# Altium footprint library 04.连接器件.pcb.PCBLIB: 363 footprints (part 13 of 23)
Each footprint in its own frame and in the unit in brackets; x right, y up, seen from the top. Pads: shape width x height; smd on the part's side, far side on the other; paste and mask are expansions set on the pad; w line width, h text height; cw(c..) or ccw(c..) is an arc to the next point about the centre after c.
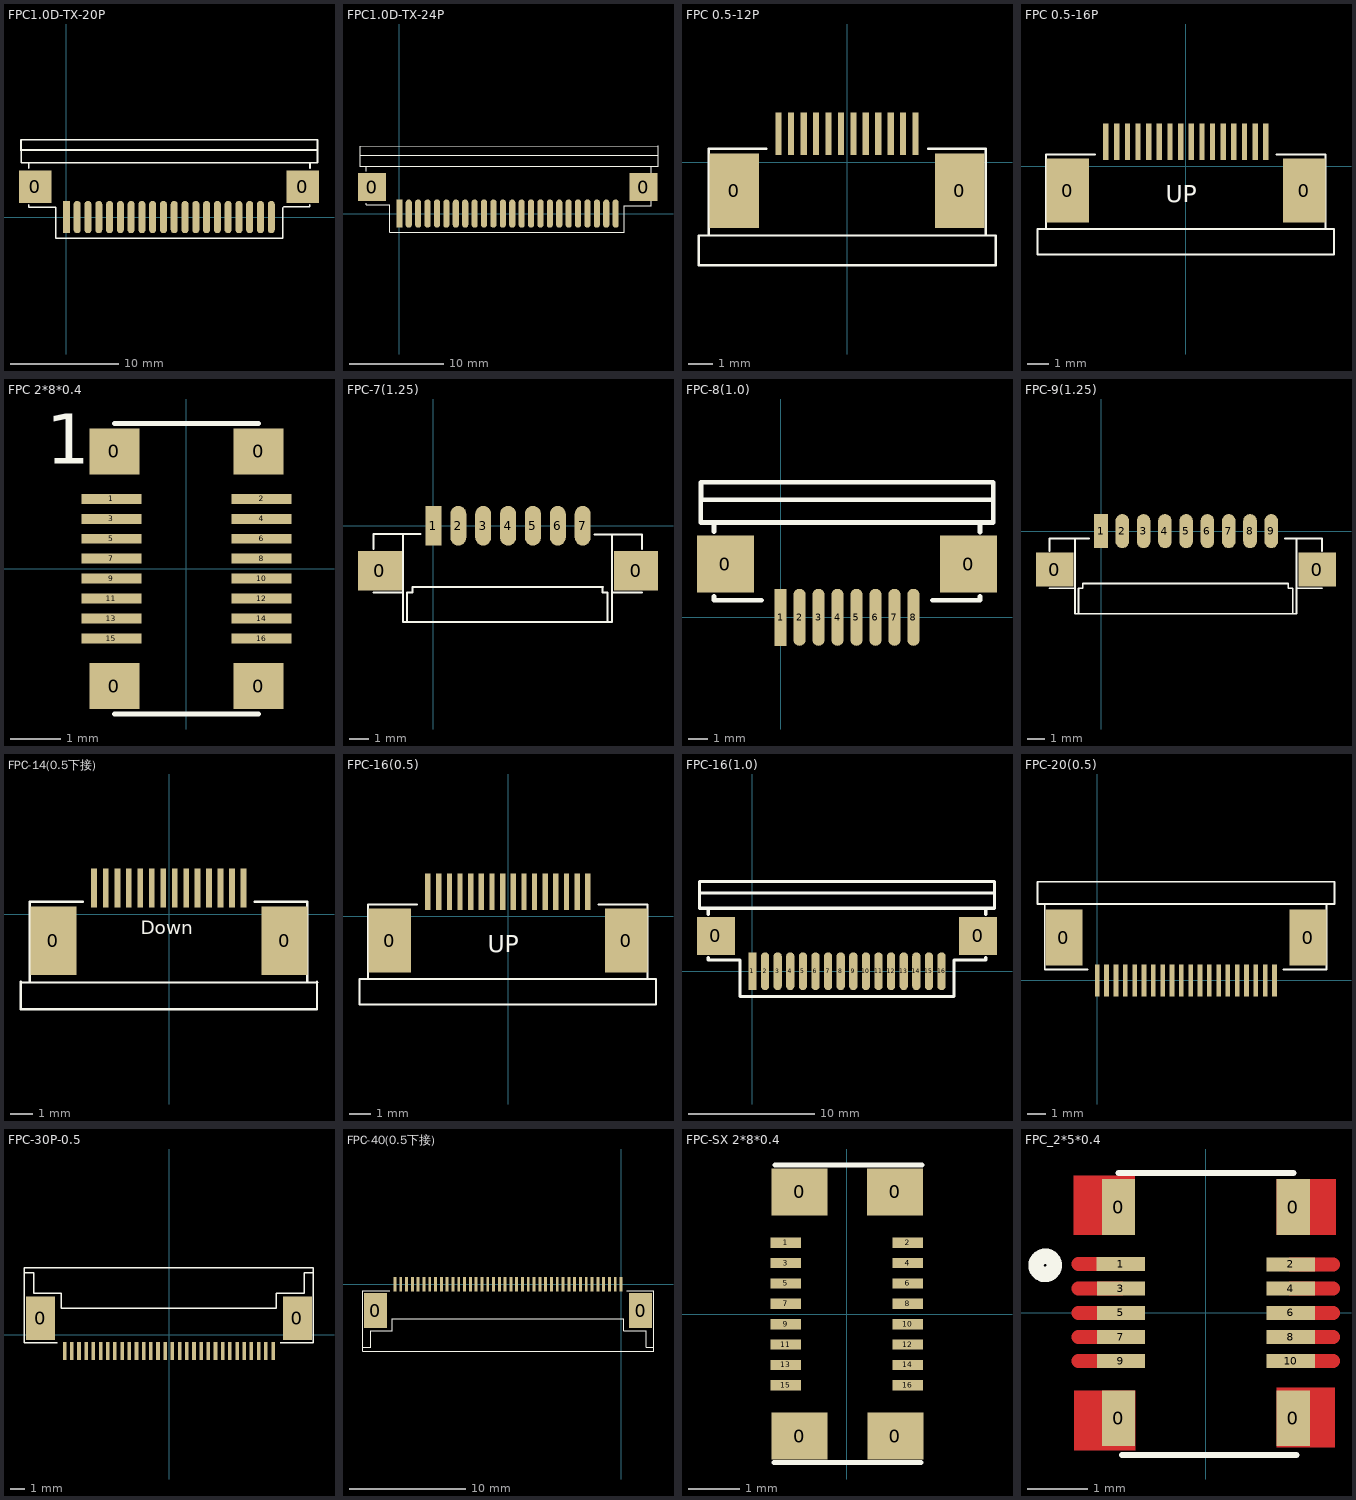
[diagram p12: the footprints below, top view; thin cyan lines are the x and y axes]

## FPC1.0D-TX-20P [mm]
pads (22):
  rect 3x3 smd: 0(-2.899,2.822) 0(21.929,2.819)
  rect 0.65x3 smd: 1(0,0)
  oval 0.65x3 smd: 2(1,0) 3(2,0) 4(3,0) 5(4,0) 6(5,0) 7(6,0) 8(7,0) 9(8,0) 10(9,0) 11(10,0) 12(11,0) 13(12,0) 14(13,0) 15(14,0) 16(15,0) 17(16,0) 18(17,0) 19(18,0) 20(19,0)
TopOverlay:
  lines w0.15: -4.199,6.222 23.3,6.223 ; -3.499,1.122 -3.499,0.922 -0.999,0.922 -0.999,-1.978 20.049,-1.981 20.049,0.838 20.151,0.94 22.564,0.94 22.564,1.143 ; -3.499,4.522 -3.499,5.022 -4.199,5.022 ; 22.589,5.029 -4.199,5.022 ; 22.591,4.514 22.591,5.022 23.291,5.022 23.291,7.122 ; 23.3,7.163 -4.208,7.188 -4.199,5.022

## FPC1.0D-TX-24P [mm]
pads (26):
  rect 3x3 smd: 0(-2.899,2.822) 0(25.961,2.822)
  rect 0.65x3 smd: 1(0,0)
  oval 0.65x3 smd: 2(1,0) 3(2,0) 4(3,0) 5(4,0) 6(5,0) 7(6,0) 8(7,0) 9(8,0) 10(9,0) 11(10,0) 12(11,0) 13(12,0) 14(13,0) 15(14,0) 16(15,0) 17(16,0) 18(17,0) 19(18,0) 20(19,0) 21(20,0) 22(21,0) 23(22,0) 24(23,0)
TopOverlay:
  lines w0.1: -4.199,6.222 27.5,6.223 ; -3.499,1.122 -3.499,0.922 -0.999,0.922 -0.999,-1.978 23.927,-1.981 23.927,0.838 26.799,0.838 26.799,1.295 ; -3.499,4.522 -3.499,5.022 -4.199,5.022 ; 26.799,4.369 26.799,5.029 ; -4.199,5.022 -4.208,7.188 27.5,7.214 27.5,5.029 -4.199,5.022

## FPC 0.5-12P [mm]
pads (14):
  rect 2x3 smd: 0(-4.536,-1.146) 0(4.536,-1.146)
  rect 0.25x1.7 smd: 1(-2.758,1.146) 2(-2.25,1.146) 3(-1.742,1.146) 4(-1.242,1.146) 5(-0.742,1.146) 6(-0.242,1.146) 7(0.258,1.146) 8(0.758,1.146) 9(1.258,1.146) 10(1.758,1.146) 11(2.258,1.146) 12(2.758,1.146)
TopOverlay:
  lines w0.1: -5.566,-2.946 -5.566,0.554 -3.258,0.554 ; 3.275,0.554 5.583,0.554 5.583,-2.946 ; -5.961,-4.146 -5.961,-2.946 5.986,-2.946 5.986,-4.146 -5.961,-4.146
3D body: height 2.3, standoff 0, extent -3.515,-2.925 3.507,0.55
3D body: height 0.3, standoff 0, extent -2.89,0.2 -2.64,1.65
3D body: height 0.3, standoff 0, extent -2.382,0.2 -2.132,1.65
3D body: height 0.3, standoff 0, extent -1.874,0.2 -1.624,1.65
3D body: height 0.3, standoff 0, extent -1.374,0.2 -1.124,1.65
3D body: height 0.3, standoff 0, extent -0.874,0.2 -0.624,1.65
3D body: height 0.3, standoff 0, extent -0.374,0.2 -0.124,1.65
3D body: height 0.3, standoff 0, extent 0.126,0.2 0.376,1.65
3D body: height 0.3, standoff 0, extent 0.626,0.2 0.876,1.65
3D body: height 0.3, standoff 0, extent 1.126,0.2 1.376,1.65
3D body: height 0.3, standoff 0, extent 1.626,0.2 1.876,1.65
3D body: height 0.3, standoff 0, extent 2.126,0.2 2.376,1.65
3D body: height 0.3, standoff 0, extent 2.626,0.2 2.876,1.65
3D body: height 2.4, standoff 0, extent 3.448,-2.921 5.748,0.554
3D body: height 2.4, standoff 0, extent -5.707,-2.95 -3.407,0.525
3D body: height 2.4, standoff 0, extent -5.986,-4.198 6.039,-2.896

## FPC 0.5-16P [mm]
pads (18):
  rect 2x3 smd: 0(-5.546,-1.146) 0(5.546,-1.146)
  rect 0.25x1.7 smd: 1(-3.768,1.146) 2(-3.26,1.146) 3(-2.752,1.146) 4(-2.252,1.146) 5(-1.752,1.146) 6(-1.252,1.146) 7(-0.752,1.146) 8(-0.252,1.146) 9(0.248,1.146) 10(0.748,1.146) 11(1.248,1.146) 12(1.748,1.146) 13(2.248,1.146) 14(2.748,1.146) 15(3.248,1.146) 16(3.748,1.146)
TopOverlay:
  lines w0.1: -6.577,-2.946 -6.577,0.554 -4.268,0.554 ; 4.248,0.554 6.556,0.554 6.556,-2.946 ; 6.95,-4.146 -6.972,-4.146 -6.972,-2.946 6.95,-2.946 ; 6.951,-4.146 6.951,-2.946
  text "UP" at -0.94,-1.702 h0.8
3D body: height 2.4, standoff 0, extent -6.996,-4.175 6.95,-2.896
3D body: height 2.4, standoff 0, extent -6.717,-2.95 -4.417,0.525
3D body: height 2.4, standoff 0, extent 4.375,-2.95 6.675,0.525
3D body: height 0.3, standoff 0, extent 3.616,0.2 3.866,1.65
3D body: height 0.3, standoff 0, extent 3.116,0.2 3.366,1.65
3D body: height 0.3, standoff 0, extent 2.616,0.2 2.866,1.65
3D body: height 0.3, standoff 0, extent 2.116,0.2 2.366,1.65
3D body: height 0.3, standoff 0, extent 1.616,0.2 1.866,1.65
3D body: height 0.3, standoff 0, extent 1.116,0.2 1.366,1.65
3D body: height 0.3, standoff 0, extent 0.616,0.2 0.866,1.65
3D body: height 0.3, standoff 0, extent 0.116,0.2 0.366,1.65
3D body: height 0.3, standoff 0, extent -0.384,0.2 -0.134,1.65
3D body: height 0.3, standoff 0, extent -0.884,0.2 -0.634,1.65
3D body: height 0.3, standoff 0, extent -1.384,0.2 -1.134,1.65
3D body: height 0.3, standoff 0, extent -1.884,0.2 -1.634,1.65
3D body: height 0.3, standoff 0, extent -2.384,0.2 -2.134,1.65
3D body: height 0.3, standoff 0, extent -2.884,0.2 -2.634,1.65
3D body: height 0.3, standoff 0, extent -3.392,0.2 -3.142,1.65
3D body: height 0.3, standoff 0, extent -3.9,0.2 -3.65,1.65
3D body: height 2.3, standoff 0, extent -4.525,-2.925 4.525,0.55

## FPC 2*8*0.4 [mm]
pads (20):
  rect 1x0.92 smd: 0(-1.445,-2.35) 0(-1.445,2.35) 0(1.445,-2.35) 0(1.445,2.35)
  rect 1.2x0.2 smd: 1(-1.505,1.4) 2(1.505,1.4) 3(-1.505,1) 4(1.505,1) 5(-1.505,0.6) 6(1.505,0.6) 7(-1.505,0.2) 8(1.505,0.2) 9(-1.505,-0.2) 10(1.505,-0.2) 11(-1.505,-0.6) 12(1.505,-0.6) 13(-1.505,-1) 14(1.505,-1) 15(-1.505,-1.4) 16(1.505,-1.4)
TopOverlay:
  lines w0.1: -1.445,-2.91 1.445,-2.91 ; -1.445,2.91 1.445,2.91
  text "1" at -2.803,2.099 h1
3D body: height 0.85, standoff 0, extent -1.45,-2.925 1.475,2.9

## FPC-7(1.25) [mm]
pads (9):
  rect 2.2x2 smd: 0(-2.692,-2.261) 0(10.185,-2.261)
  rect 0.8x2 smd: 1(0,0)
  oval 0.8x2 smd: 2(1.25,0) 3(2.5,0) 4(3.75,0) 5(5,0) 6(6.25,0) 7(7.5,0)
TopOverlay:
  lines w0.1: -3.023,-3.353 -1.523,-3.353 ; -3.023,-1.17 -3.023,-0.428 -0.639,-0.428 ; -1.523,-0.432 -1.523,-3.353 ; -1.319,-4.853 -1.319,-3.353 -1.065,-3.353 -1.065,-3.073 8.509,-3.073 ; 8.081,-0.432 10.465,-0.432 ; 8.5,-3.073 8.5,-3.353 8.754,-3.353 8.754,-4.853 ; 8.966,-4.851 -1.523,-4.853 -1.523,-3.353 ; 8.977,-4.853 8.977,-3.353 8.977,-0.437 ; 8.977,-3.358 10.477,-3.358 ; 10.477,-1.175 10.477,-0.432

## FPC-8(1.0) [mm]
pads (10):
  rect 3x3 smd: 0(-2.9,2.8) 0(9.9,2.8)
  rect 0.65x3 smd: 1(0,0)
  oval 0.65x3 smd: 2(1,0) 3(2,0) 4(3,0) 5(4,0) 6(5,0) 7(6,0) 8(7,0)
TopOverlay:
  lines w0.254: -4.2,6.2 11.2,6.192 ; -3.5,1.1 -3.5,0.9 -1,0.9 ; -3.5,4.5 -3.5,5 -4.2,5 ; 8,0.9 10.5,0.9 10.5,1.1 ; 10.5,4.492 10.5,5 11.2,5 ; 11.176,7.112 -4.191,7.112 -4.2,5 ; 11.2,7.1 11.2,5 ; -4.2,5 11.2,5
3D body: height 2.5, standoff 0, extent -4.2,0.9 11.2,7.112

## FPC-9(1.25) [mm]
pads (11):
  rect 2.2x2 smd: 0(-2.718,-2.261) 0(12.7,-2.261)
  rect 0.8x2 smd: 1(0,0)
  oval 0.8x2 smd: 2(1.25,0) 3(2.5,0) 4(3.75,0) 5(5,0) 6(6.25,0) 7(7.5,0) 8(8.75,0) 9(10,0)
TopOverlay:
  lines w0.1: -3.023,-3.353 -1.523,-3.353 ; -3.023,-1.17 -3.023,-0.428 -0.707,-0.428 ; -1.523,-0.432 -1.523,-3.353 ; -1.319,-4.853 -1.319,-3.353 -1.065,-3.353 -1.065,-3.073 11,-3.073 11,-3.353 11.254,-3.353 11.254,-4.853 ; 10.791,-0.428 12.977,-0.428 ; 11.477,-3.358 12.977,-3.358 ; 11.477,-0.437 11.477,-3.353 11.477,-4.853 -1.523,-4.853 -1.523,-3.353 ; 12.977,-1.175 12.977,-0.432

## FPC-14(0.5下接) [mm]
pads (16):
  rect 2x3 smd: 0(-5.046,-1.146) 0(5.046,-1.146)
  rect 0.25x1.7 smd: 1(-3.268,1.146) 2(-2.76,1.146) 3(-2.252,1.146) 4(-1.752,1.146) 5(-1.252,1.146) 6(-0.752,1.146) 7(-0.252,1.146) 8(0.248,1.146) 9(0.748,1.146) 10(1.248,1.146) 11(1.748,1.146) 12(2.248,1.146) 13(2.748,1.146) 14(3.248,1.146)
TopOverlay:
  lines w0.1: -6.472,-4.146 -6.472,-2.946 ; -6.472,-2.971 6.474,-2.971 ; -6.418,-4.146 6.461,-4.146 6.461,-2.946 ; -6.077,-2.946 -6.077,0.554 -3.768,0.554 ; 3.732,0.554 6.036,0.554 6.036,-2.946
  text "Down" at -1.243,-1.054 h1

## FPC-16(0.5) [mm]
pads (18):
  rect 2x3 smd: 0(-5.546,-1.146) 0(5.546,-1.146)
  rect 0.25x1.7 smd: 1(-3.768,1.146) 2(-3.26,1.146) 3(-2.752,1.146) 4(-2.252,1.146) 5(-1.752,1.146) 6(-1.252,1.146) 7(-0.752,1.146) 8(-0.252,1.146) 9(0.248,1.146) 10(0.748,1.146) 11(1.248,1.146) 12(1.748,1.146) 13(2.248,1.146) 14(2.748,1.146) 15(3.248,1.146) 16(3.748,1.146)
TopOverlay:
  lines w0.1: -6.577,-2.946 -6.577,0.554 -4.268,0.554 ; 4.248,0.554 6.556,0.554 6.556,-2.946 ; 6.95,-4.146 -6.972,-4.146 -6.972,-2.946 6.95,-2.946 ; 6.951,-4.146 6.951,-2.946
  text "UP" at -0.94,-1.702 h0.8
3D body: height 2.3, standoff 0, extent -4.525,-2.925 4.525,0.55
3D body: height 0.3, standoff 0, extent -3.9,0.2 -3.65,1.65
3D body: height 0.3, standoff 0, extent -3.392,0.2 -3.142,1.65
3D body: height 0.3, standoff 0, extent -2.884,0.2 -2.634,1.65
3D body: height 0.3, standoff 0, extent -2.384,0.2 -2.134,1.65
3D body: height 0.3, standoff 0, extent -1.884,0.2 -1.634,1.65
3D body: height 0.3, standoff 0, extent -1.384,0.2 -1.134,1.65
3D body: height 0.3, standoff 0, extent -0.884,0.2 -0.634,1.65
3D body: height 0.3, standoff 0, extent -0.384,0.2 -0.134,1.65
3D body: height 0.3, standoff 0, extent 0.116,0.2 0.366,1.65
3D body: height 0.3, standoff 0, extent 0.616,0.2 0.866,1.65
3D body: height 0.3, standoff 0, extent 1.116,0.2 1.366,1.65
3D body: height 0.3, standoff 0, extent 1.616,0.2 1.866,1.65
3D body: height 0.3, standoff 0, extent 2.116,0.2 2.366,1.65
3D body: height 0.3, standoff 0, extent 2.616,0.2 2.866,1.65
3D body: height 0.3, standoff 0, extent 3.116,0.2 3.366,1.65
3D body: height 0.3, standoff 0, extent 3.616,0.2 3.866,1.65
3D body: height 2.4, standoff 0, extent 4.375,-2.95 6.675,0.525
3D body: height 2.4, standoff 0, extent -6.717,-2.95 -4.417,0.525
3D body: height 2.4, standoff 0, extent -6.996,-4.175 6.95,-2.896

## FPC-16(1.0) [mm]
pads (18):
  rect 3x3 smd: 0(-2.9,2.8) 0(17.9,2.8)
  rect 0.65x3 smd: 1(0,0)
  oval 0.65x3 smd: 2(1,0) 3(2,0) 4(3,0) 5(4,0) 6(5,0) 7(6,0) 8(7,0) 9(8,0) 10(9,0) 11(10,0) 12(11,0) 13(12,0) 14(13,0) 15(14,0) 16(15,0)
TopOverlay:
  lines w0.254: -4.2,6.2 19.191,6.188 ; -3.5,1.1 -3.5,0.9 -1,0.9 -1,-2 16,-2 16,0.9 18.5,0.9 18.5,1.1 ; -3.5,4.5 -3.5,5 -4.2,5 ; 18.5,4.492 18.5,5 19.2,5 ; 19.188,7.112 -4.191,7.112 -4.2,5 ; 19.2,7.1 19.2,5 ; -4.2,5 19.2,5

## FPC-20(0.5) [mm]
pads (22):
  rect 2x3 smd: 0(-1.778,2.292) 0(11.314,2.292)
  rect 0.25x1.7 smd: 1(0,0) 2(0.508,0) 3(1.016,0) 4(1.516,0) 5(2.016,0) 6(2.516,0) 7(3.016,0) 8(3.516,0) 9(4.016,0) 10(4.516,0) 11(5.016,0) 12(5.516,0) 13(6.016,0) 14(6.516,0) 15(7.016,0) 16(7.516,0) 17(8.016,0) 18(8.516,0) 19(9.016,0) 20(9.516,0)
TopOverlay:
  lines w0.1: -2.808,4.092 -2.808,0.592 -0.5,0.592 ; 10,0.592 12.305,0.592 12.305,4.092 ; -3.203,4.092 12.729,4.092 12.729,5.292 12,5.292 -3.203,5.292 -3.203,4.092

## FPC-30P-0.5 [mm]
pads (32):
  rect 2x3 smd: 0(-8.939,1.143) 0(8.939,1.143)
  rect 0.25x1.25 smd: 1(7.253,-1.143) 2(6.745,-1.143) 3(6.237,-1.143) 4(5.737,-1.143) 5(5.237,-1.143) 6(4.737,-1.143) 7(4.237,-1.143) 8(3.737,-1.143) 9(3.237,-1.143) 10(2.737,-1.143) 11(2.237,-1.143) 12(1.737,-1.143) 13(1.237,-1.143) 14(0.737,-1.143) 15(0.237,-1.143) 16(-0.263,-1.143) 17(-0.763,-1.143) 18(-1.263,-1.143) 19(-1.763,-1.143) 20(-2.263,-1.143) 21(-2.763,-1.143) 22(-3.263,-1.143) 23(-3.763,-1.143) 24(-4.263,-1.143) 25(-4.763,-1.143) 26(-5.262,-1.143) 27(-5.762,-1.143) 28(-6.262,-1.143) 29(-6.762,-1.143) 30(-7.262,-1.143)
TopOverlay:
  lines w0.1: -10.06,4.318 -9.425,4.318 -9.425,2.87 -7.494,2.87 -7.494,1.854 2.466,1.854 7.466,1.854 7.466,2.87 9.396,2.87 9.396,4.318 10.031,4.318 ; -7.762,-0.551 -10.071,-0.551 -10.071,4.642 5.042,4.642 10.042,4.642 10.042,-0.551 7.737,-0.551
3D body: height 0.2, standoff 0, extent -7.516,-1.778 7.47,-0.508
3D body: height 2, standoff 0, extent -10.056,-0.635 10.01,4.699

## FPC-40(0.5下接) [mm] "0.5K-DX-20PWB掀盖"
height 2
pads (42):
  rect 2x3 smd: 0(-21.192,-2.286) 0(1.692,-2.286)
  rect 0.25x1.25 smd: 1(0,0) 2(-0.5,0) 3(-1,0) 4(-1.5,0) 5(-2,0) 6(-2.5,0) 7(-3,0) 8(-3.5,0) 9(-4,0) 10(-4.5,0) 11(-5,0) 12(-5.5,0) 13(-6,0) 14(-6.5,0) 15(-7,0) 16(-7.5,0) 17(-8,0) 18(-8.5,0) 19(-9,0) 20(-9.5,0) 21(-10,0) 22(-10.5,0) 23(-11,0) 24(-11.5,0) 25(-12,0) 26(-12.5,0) 27(-13,0) 28(-13.5,0) 29(-14,0) 30(-14.5,0) 31(-15,0) 32(-15.5,0) 33(-16,0) 34(-16.5,0) 35(-17,0) 36(-17.5,0) 37(-18,0) 38(-18.5,0) 39(-19,0) 40(-19.5,0)
TopOverlay:
  lines w0.1: -22.282,-5.461 -21.59,-5.461 -21.59,-4.013 -19.748,-4.013 -19.748,-3.189 -19.748,-2.997 0.248,-2.997 0.248,-4.013 2.178,-4.013 2.178,-5.461 2.813,-5.461 ; -19.974,-0.592 -22.285,-0.592 -22.285,-5.785 2.824,-5.785 2.824,-0.592 0.516,-0.592

## FPC-SX 2*8*0.4 [mm]
pads (20):
  rect 1.1x0.92 smd: 0(-0.93,-2.4) 0(-0.93,2.4) 0(0.95,2.4) 0(0.957,-2.4)
  rect 0.6x0.2 smd: 1(-1.2,1.4) 2(1.2,1.4) 3(-1.2,1) 4(1.2,1) 5(-1.2,0.6) 6(1.2,0.6) 7(-1.2,0.2) 8(1.2,0.2) 9(-1.2,-0.2) 10(1.2,-0.2) 11(-1.2,-0.6) 12(1.2,-0.6) 13(-1.2,-1) 14(1.2,-1) 15(-1.2,-1.4) 16(1.2,-1.4)
TopOverlay:
  lines w0.1: -1.434,-2.917 1.456,-2.917 ; -1.414,2.933 1.476,2.933
3D body: height 0.85, standoff 0, extent -1.259,-2.54 1.268,2.56

## FPC_2*5*0.4 [mm]
pads (14):
  rect 0.55x0.92 smd: 0(-1.445,-1.748) 0(-1.445,1.748) 0(1.445,-1.748) 0(1.445,1.748)
  rect 0.8x0.23 smd: 1(-1.41,0.802) 2(1.405,0.798) 3(-1.405,0.398) 4(1.405,0.398) 5(-1.405,-0.002) 6(1.405,-0.002) 7(-1.405,-0.402) 8(1.405,-0.402) 9(-1.405,-0.802) 10(1.405,-0.802)
TopLayer:
  rectangle: 1.17,1.288 2.152,2.209
  rectangle: 1.17,-2.227 2.135,-1.236
  rectangle: -2.184,-2.281 -1.168,-1.29
  rectangle: -2.192,1.282 -1.176,2.273
  lines w0.23: -2.11,0.802 -1.41,0.802 ; -2.105,-0.802 -1.405,-0.802 ; -2.105,-0.402 -1.405,-0.402 ; -2.105,-0.002 -1.405,-0.002 ; -2.105,0.398 -1.405,0.398 ; 1.405,-0.802 2.105,-0.802 ; 1.405,-0.402 2.105,-0.402 ; 1.405,-0.002 2.105,-0.002 ; 1.405,0.398 2.105,0.398 ; 1.405,0.798 2.105,0.798
TopOverlay:
  circle w0.254: c-2.658,0.784 r0.152
  lines w0.1: -1.445,2.308 1.445,2.308 ; -1.388,-2.351 1.502,-2.351
TopSolder:
  rectangle: -2.137,-2.224 -1.121,-1.234
  region: 2.135,-1.237 1.119,-1.237 1.119,-2.227 2.135,-2.227
  rectangle: -2.192,1.282 -1.176,2.273
  lines w0.23: -2.105,-0.802 -1.405,-0.802 ; -2.105,-0.402 -1.405,-0.402 ; -2.105,0.398 -1.405,0.398 ; -2.105,0.798 -1.405,0.798 ; 1.405,-0.802 2.105,-0.802 ; 1.405,-0.402 2.105,-0.402 ; 1.405,0.398 2.105,0.398 ; 1.405,0.798 2.105,0.798 ; 1.405,-0.002 2.105,-0.002 1.405,-0.002
3D body: height 2.5, standoff 0.5, extent -1.917,-2.32 1.89,2.315